# Altium footprint library WR-TBL_Pluggable PCB Header_3.81mm.PcbLib: 198 footprints (part 4 of 13)
Each footprint in its own frame and in the unit in brackets; x right, y up, seen from the top. Pads: shape width x height; smd on the part's side, far side on the other; paste and mask are expansions set on the pad; w line width, h text height; cw(c..) or ccw(c..) is an arc to the next point about the centre after c.
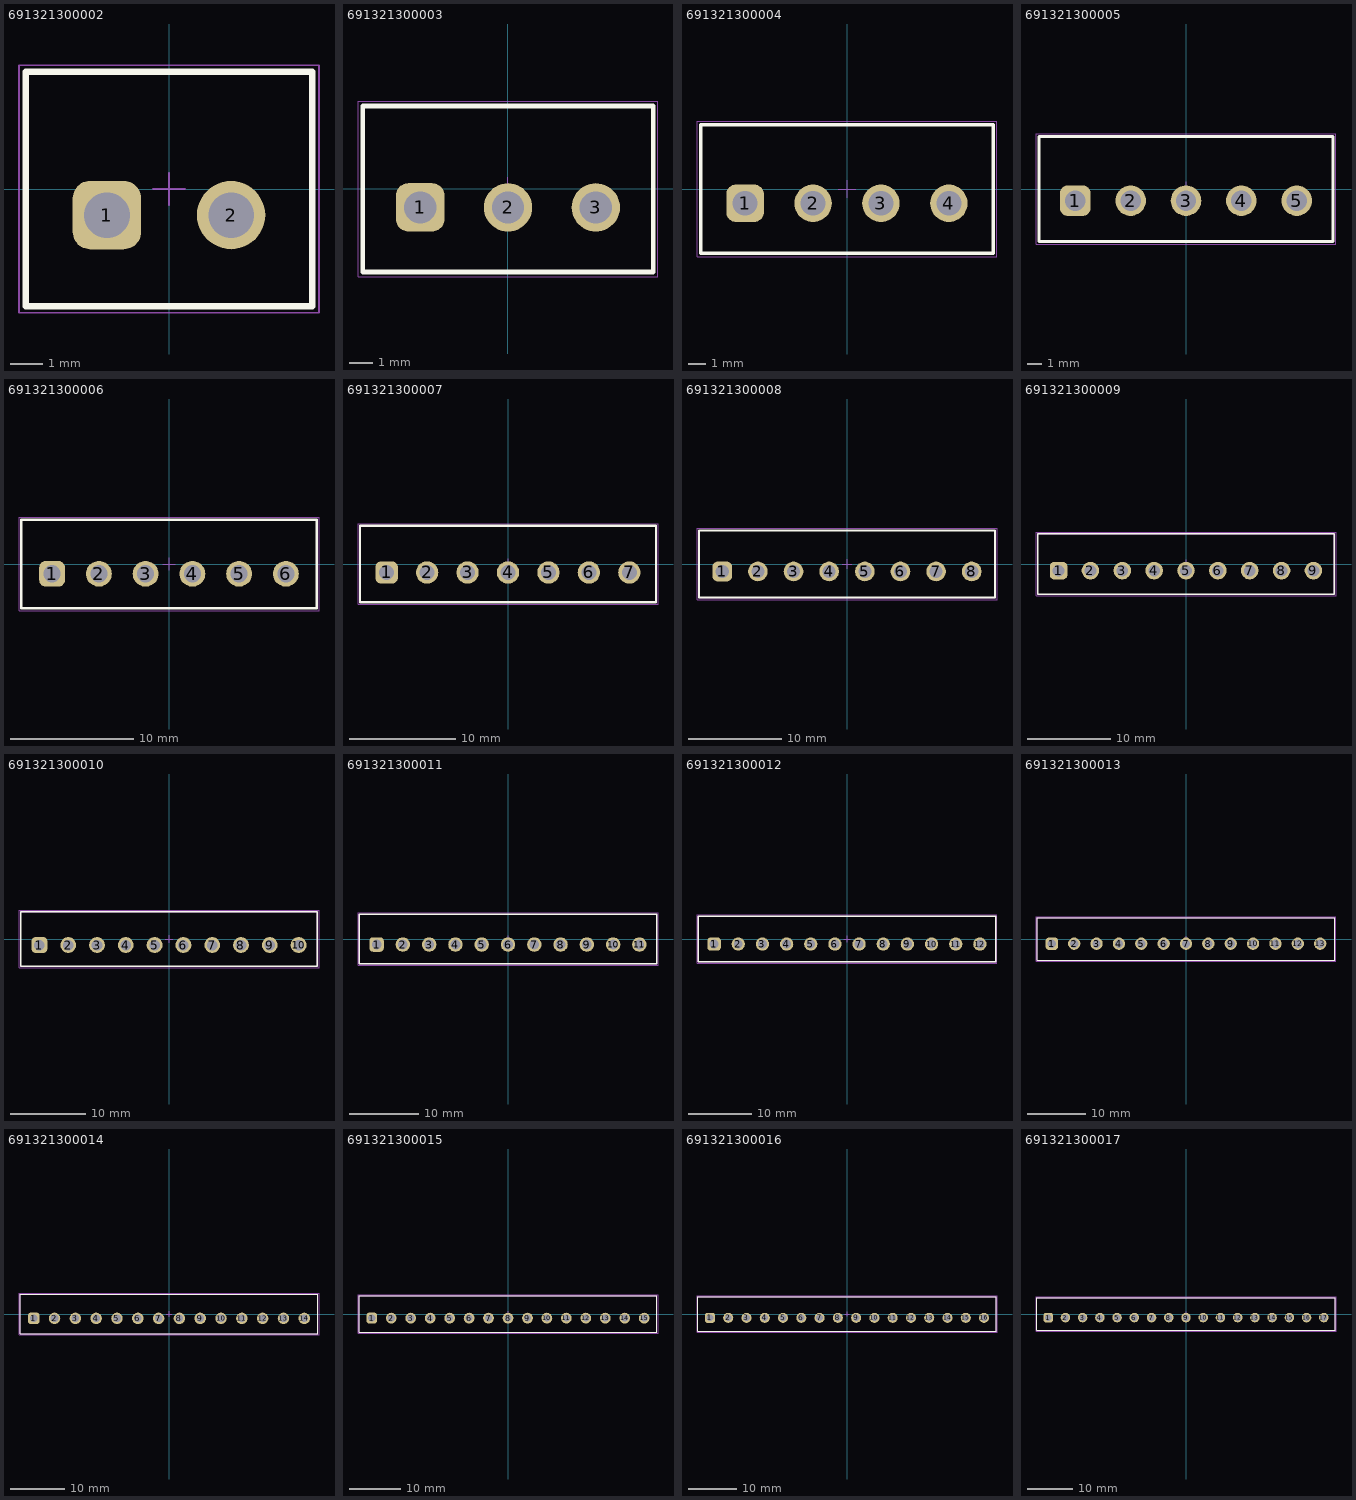
[diagram p3: the footprints below, top view; thin cyan lines are the x and y axes]

## 691321300002 [mm] "Vertical PCB Header, pitch 3.81mm, 02p"
height 9.2
pads (2):
  rrect50% 2.1x2.1 hole 1.4: 1(-1.905,-0.8)
  round 2.1 hole 1.4: 2(1.905,-0.8)
Top Overlay:
  lines w0.2: -4.405,-3.6 4.405,-3.6 4.405,3.6 -4.405,3.6 -4.405,-3.6
Top Designator:
  text ".Designator" at -7.498,-0.5 h1.5
Top Component Outline:
  lines w0.1: -4.405,-3.6 -4.405,3.6 4.405,3.6 4.405,-3.6 -4.405,-3.6
Top 3D Body:
  lines w0.1: -4.405,-3.6 4.405,-3.6 4.405,3.6 -4.405,3.6 -4.405,-3.6
Top Courtyard:
  lines w0.05: -0.5,0 0.5,0 ; 0,-0.5 0,0.5 ; -4.605,-3.8 -4.605,3.8 4.605,3.8 4.605,-3.8 -4.605,-3.8
3D body "691321300002.stp": height 9.25, standoff -3.45, extent -4.405,-3.6 4.405,3.6

## 691321300003 [mm] "Vertical PCB Header, pitch 3.81mm, 03p"
height 9.2
pads (3):
  rrect50% 2.1x2.1 hole 1.4: 1(-3.81,-0.8)
  round 2.1 hole 1.4: 2(0,-0.8) 3(3.81,-0.8)
Top Overlay:
  lines w0.2: -6.31,-3.6 -6.31,3.6 6.31,3.6 6.31,-3.6 -6.31,-3.6
Top Designator:
  text ".Designator" at -7.498,-0.5 h1.5
Top Component Outline:
  lines w0.1: -6.31,-3.6 6.31,-3.6 6.31,3.6 -6.31,3.6 -6.31,-3.6
Top 3D Body:
  lines w0.1: -6.31,-3.6 -6.31,3.6 6.31,3.6 6.31,-3.6 -6.31,-3.6
Top Courtyard:
  lines w0.05: -0.5,0 0.5,0 ; 0,-0.5 0,0.5 ; -6.51,-3.8 6.51,-3.8 6.51,3.8 -6.51,3.8 -6.51,-3.8
3D body "691321300003.stp": height 9.25, standoff -3.45, extent -6.31,-3.6 6.31,3.6

## 691321300004 [mm] "Vertical PCB Header, pitch 3.81mm, 04p"
height 9.2
pads (4):
  rrect50% 2.1x2.1 hole 1.4: 1(-5.715,-0.8)
  round 2.1 hole 1.4: 2(-1.905,-0.8) 3(1.905,-0.8) 4(5.715,-0.8)
Top Overlay:
  lines w0.2: -8.215,-3.6 -8.215,3.6 8.215,3.6 8.215,-3.6 -8.215,-3.6
Top Designator:
  text ".Designator" at -7.498,-0.5 h1.5
Top Component Outline:
  lines w0.1: -8.215,-3.6 8.215,-3.6 8.215,3.6 -8.215,3.6 -8.215,-3.6
Top 3D Body:
  lines w0.1: -8.215,-3.6 -8.215,3.6 8.215,3.6 8.215,-3.6 -8.215,-3.6
Top Courtyard:
  lines w0.05: -0.5,0 0.5,0 ; 0,-0.5 0,0.5 ; -8.415,-3.8 8.415,-3.8 8.415,3.8 -8.415,3.8 -8.415,-3.8
3D body "691321300004.stp": height 9.25, standoff -3.45, extent -8.215,-3.6 8.215,3.6

## 691321300005 [mm] "Vertical PCB Header, pitch 3.81mm, 05p"
height 9.2
pads (5):
  rrect50% 2.1x2.1 hole 1.4: 1(-7.62,-0.8)
  round 2.1 hole 1.4: 2(-3.81,-0.8) 3(0,-0.8) 4(3.81,-0.8) 5(7.62,-0.8)
Top Overlay:
  lines w0.2: -10.12,-3.6 -10.12,3.6 10.12,3.6 10.12,-3.6 -10.12,-3.6
Top Designator:
  text ".Designator" at -7.498,-0.5 h1.5
Top Component Outline:
  lines w0.1: -10.12,-3.6 10.12,-3.6 10.12,3.6 -10.12,3.6 -10.12,-3.6
Top 3D Body:
  lines w0.1: -10.12,-3.6 -10.12,3.6 10.12,3.6 10.12,-3.6 -10.12,-3.6
Top Courtyard:
  lines w0.05: -0.5,0 0.5,0 ; 0,-0.5 0,0.5 ; -10.32,-3.8 10.32,-3.8 10.32,3.8 -10.32,3.8 -10.32,-3.8
3D body "691321300005.stp": height 9.25, standoff -3.45, extent -10.12,-3.6 10.12,3.6

## 691321300006 [mm] "Vertical PCB Header, pitch 3.81mm, 06p"
height 9.2
pads (6):
  rrect50% 2.1x2.1 hole 1.4: 1(-9.525,-0.8)
  round 2.1 hole 1.4: 2(-5.715,-0.8) 3(-1.905,-0.8) 4(1.905,-0.8) 5(5.715,-0.8) 6(9.525,-0.8)
Top Overlay:
  lines w0.2: -12.025,-3.6 12.025,-3.6 12.025,3.6 -12.025,3.6 -12.025,-3.6
Top Designator:
  text ".Designator" at -7.498,-0.5 h1.5
Top Component Outline:
  lines w0.1: -12.025,-3.6 -12.025,3.6 12.025,3.6 12.025,-3.6 -12.025,-3.6
Top 3D Body:
  lines w0.1: -12.025,-3.6 12.025,-3.6 12.025,3.6 -12.025,3.6 -12.025,-3.6
Top Courtyard:
  lines w0.05: -0.5,0 0.5,0 ; 0,-0.5 0,0.5 ; -12.225,-3.8 -12.225,3.8 12.225,3.8 12.225,-3.8 -12.225,-3.8
3D body "691321300006.stp": height 9.25, standoff -3.45, extent -12.025,-3.6 12.025,3.6

## 691321300007 [mm] "Vertical PCB Header, pitch 3.81mm, 07p"
height 9.2
pads (7):
  rrect50% 2.1x2.1 hole 1.4: 1(-11.43,-0.8)
  round 2.1 hole 1.4: 2(-7.62,-0.8) 3(-3.81,-0.8) 4(0,-0.8) 5(3.81,-0.8) 6(7.62,-0.8) 7(11.43,-0.8)
Top Overlay:
  lines w0.2: -13.93,-3.6 -13.93,3.6 13.93,3.6 13.93,-3.6 -13.93,-3.6
Top Designator:
  text ".Designator" at -7.498,-0.5 h1.5
Top Component Outline:
  lines w0.1: -13.93,-3.6 13.93,-3.6 13.93,3.6 -13.93,3.6 -13.93,-3.6
Top 3D Body:
  lines w0.1: -13.93,-3.6 -13.93,3.6 13.93,3.6 13.93,-3.6 -13.93,-3.6
Top Courtyard:
  lines w0.05: -0.5,0 0.5,0 ; 0,-0.5 0,0.5 ; -14.13,-3.8 14.13,-3.8 14.13,3.8 -14.13,3.8 -14.13,-3.8
3D body "691321300007.stp": height 9.25, standoff -3.45, extent -13.93,-3.6 13.93,3.6

## 691321300008 [mm] "Vertical PCB Header, pitch 3.81mm, 08p"
height 9.2
pads (8):
  rrect50% 2.1x2.1 hole 1.4: 1(-13.335,-0.8)
  round 2.1 hole 1.4: 2(-9.525,-0.8) 3(-5.715,-0.8) 4(-1.905,-0.8) 5(1.905,-0.8) 6(5.715,-0.8) 7(9.525,-0.8) 8(13.335,-0.8)
Top Overlay:
  lines w0.2: -15.835,-3.6 -15.835,3.6 15.835,3.6 15.835,-3.6 -15.835,-3.6
Top Designator:
  text ".Designator" at -7.498,-0.5 h1.5
Top Component Outline:
  lines w0.1: -15.835,-3.6 15.835,-3.6 15.835,3.6 -15.835,3.6 -15.835,-3.6
Top 3D Body:
  lines w0.1: -15.835,-3.6 -15.835,3.6 15.835,3.6 15.835,-3.6 -15.835,-3.6
Top Courtyard:
  lines w0.05: -0.5,0 0.5,0 ; 0,-0.5 0,0.5 ; -16.035,-3.8 16.035,-3.8 16.035,3.8 -16.035,3.8 -16.035,-3.8
3D body "691321300008.stp": height 9.25, standoff -3.45, extent -15.835,-3.6 15.835,3.6

## 691321300009 [mm] "Vertical PCB Header, pitch 3.81mm, 09p"
height 9.2
pads (9):
  rrect50% 2.1x2.1 hole 1.4: 1(-15.24,-0.8)
  round 2.1 hole 1.4: 2(-11.43,-0.8) 3(-7.62,-0.8) 4(-3.81,-0.8) 5(0,-0.8) 6(3.81,-0.8) 7(7.62,-0.8) 8(11.43,-0.8) 9(15.24,-0.8)
Top Overlay:
  lines w0.2: -17.74,-3.6 17.74,-3.6 17.74,3.6 -17.74,3.6 -17.74,-3.6
Top Designator:
  text ".Designator" at -7.498,-0.5 h1.5
Top Component Outline:
  lines w0.1: -17.74,-3.6 -17.74,3.6 17.74,3.6 17.74,-3.6 -17.74,-3.6
Top 3D Body:
  lines w0.1: -17.74,-3.6 17.74,-3.6 17.74,3.6 -17.74,3.6 -17.74,-3.6
Top Courtyard:
  lines w0.05: -0.5,0 0.5,0 ; 0,-0.5 0,0.5 ; -17.94,-3.8 -17.94,3.8 17.94,3.8 17.94,-3.8 -17.94,-3.8
3D body "691321300009.stp": height 9.25, standoff -3.45, extent -17.74,-3.6 17.74,3.6

## 691321300010 [mm] "Vertical PCB Header, pitch 3.81mm, 10p"
height 9.2
pads (10):
  rrect50% 2.1x2.1 hole 1.4: 1(-17.145,-0.8)
  round 2.1 hole 1.4: 2(-13.335,-0.8) 3(-9.525,-0.8) 4(-5.715,-0.8) 5(-1.905,-0.8) 6(1.905,-0.8) 7(5.715,-0.8) 8(9.525,-0.8) 9(13.335,-0.8) 10(17.145,-0.8)
Top Overlay:
  lines w0.2: -19.645,-3.6 -19.645,3.6 19.645,3.6 19.645,-3.6 -19.645,-3.6
Top Designator:
  text ".Designator" at -7.498,-0.5 h1.5
Top Component Outline:
  lines w0.1: -19.645,-3.6 19.645,-3.6 19.645,3.6 -19.645,3.6 -19.645,-3.6
Top 3D Body:
  lines w0.1: -19.645,-3.6 -19.645,3.6 19.645,3.6 19.645,-3.6 -19.645,-3.6
Top Courtyard:
  lines w0.05: -0.5,0 0.5,0 ; 0,-0.5 0,0.5 ; -19.845,-3.8 19.845,-3.8 19.845,3.8 -19.845,3.8 -19.845,-3.8
3D body "691321300010.stp": height 9.25, standoff -3.45, extent -19.645,-3.6 19.645,3.6

## 691321300011 [mm] "Vertical PCB Header, pitch 3.81mm, 11p"
height 9.2
pads (11):
  rrect50% 2.1x2.1 hole 1.4: 1(-19.05,-0.8)
  round 2.1 hole 1.4: 2(-15.24,-0.8) 3(-11.43,-0.8) 4(-7.62,-0.8) 5(-3.81,-0.8) 6(0,-0.8) 7(3.81,-0.8) 8(7.62,-0.8) 9(11.43,-0.8) 10(15.24,-0.8) 11(19.05,-0.8)
Top Overlay:
  lines w0.2: -21.55,-3.6 -21.55,3.6 21.55,3.6 21.55,-3.6 -21.55,-3.6
Top Designator:
  text ".Designator" at -7.498,-0.5 h1.5
Top Component Outline:
  lines w0.1: -21.55,-3.6 21.55,-3.6 21.55,3.6 -21.55,3.6 -21.55,-3.6
Top 3D Body:
  lines w0.1: -21.55,-3.6 -21.55,3.6 21.55,3.6 21.55,-3.6 -21.55,-3.6
Top Courtyard:
  lines w0.05: -0.5,0 0.5,0 ; 0,-0.5 0,0.5 ; -21.75,-3.8 21.75,-3.8 21.75,3.8 -21.75,3.8 -21.75,-3.8
3D body "691321300011.stp": height 9.25, standoff -3.45, extent -21.55,-3.6 21.55,3.6

## 691321300012 [mm] "Vertical PCB Header, pitch 3.81mm, 12p"
height 9.2
pads (12):
  rrect50% 2.1x2.1 hole 1.4: 1(-20.955,-0.8)
  round 2.1 hole 1.4: 2(-17.145,-0.8) 3(-13.335,-0.8) 4(-9.525,-0.8) 5(-5.715,-0.8) 6(-1.905,-0.8) 7(1.905,-0.8) 8(5.715,-0.8) 9(9.525,-0.8) 10(13.335,-0.8) 11(17.145,-0.8) 12(20.955,-0.8)
Top Overlay:
  lines w0.2: -23.455,-3.6 23.455,-3.6 23.455,3.6 -23.455,3.6 -23.455,-3.6
Top Designator:
  text ".Designator" at -7.498,-0.5 h1.5
Top Component Outline:
  lines w0.1: -23.455,-3.6 -23.455,3.6 23.455,3.6 23.455,-3.6 -23.455,-3.6
Top 3D Body:
  lines w0.1: -23.455,-3.6 23.455,-3.6 23.455,3.6 -23.455,3.6 -23.455,-3.6
Top Courtyard:
  lines w0.05: -0.5,0 0.5,0 ; 0,-0.5 0,0.5 ; -23.655,-3.8 -23.655,3.8 23.655,3.8 23.655,-3.8 -23.655,-3.8
3D body "691321300012.stp": height 9.25, standoff -3.45, extent -23.455,-3.6 23.455,3.6

## 691321300013 [mm] "Vertical PCB Header, pitch 3.81mm, 13p"
height 9.2
pads (13):
  rrect50% 2.1x2.1 hole 1.4: 1(-22.86,-0.8)
  round 2.1 hole 1.4: 2(-19.05,-0.8) 3(-15.24,-0.8) 4(-11.43,-0.8) 5(-7.62,-0.8) 6(-3.81,-0.8) 7(0,-0.8) 8(3.81,-0.8) 9(7.62,-0.8) 10(11.43,-0.8) 11(15.24,-0.8) 12(19.05,-0.8) 13(22.86,-0.8)
Top Overlay:
  lines w0.2: -25.36,-3.6 25.36,-3.6 25.36,3.6 -25.36,3.6 -25.36,-3.6
Top Designator:
  text ".Designator" at -7.498,-0.5 h1.5
Top Component Outline:
  lines w0.1: -25.36,-3.6 -25.36,3.6 25.36,3.6 25.36,-3.6 -25.36,-3.6
Top 3D Body:
  lines w0.1: -25.36,-3.6 25.36,-3.6 25.36,3.6 -25.36,3.6 -25.36,-3.6
Top Courtyard:
  lines w0.05: -0.5,0 0.5,0 ; 0,-0.5 0,0.5 ; -25.56,-3.8 -25.56,3.8 25.56,3.8 25.56,-3.8 -25.56,-3.8
3D body "691321300013.stp": height 9.25, standoff -3.45, extent -25.36,-3.6 25.36,3.6

## 691321300014 [mm] "Vertical PCB Header, pitch 3.81mm, 14p"
height 9.2
pads (14):
  rrect50% 2.1x2.1 hole 1.4: 1(-24.765,-0.8)
  round 2.1 hole 1.4: 2(-20.955,-0.8) 3(-17.145,-0.8) 4(-13.335,-0.8) 5(-9.525,-0.8) 6(-5.715,-0.8) 7(-1.905,-0.8) 8(1.905,-0.8) 9(5.715,-0.8) 10(9.525,-0.8) 11(13.335,-0.8) 12(17.145,-0.8) 13(20.955,-0.8) 14(24.765,-0.8)
Top Overlay:
  lines w0.2: -27.265,-3.6 27.265,-3.6 27.265,3.6 -27.265,3.6 -27.265,-3.6
Top Designator:
  text ".Designator" at -7.498,-0.5 h1.5
Top Component Outline:
  lines w0.1: -27.265,-3.6 -27.265,3.6 27.265,3.6 27.265,-3.6 -27.265,-3.6
Top 3D Body:
  lines w0.1: -27.265,-3.6 27.265,-3.6 27.265,3.6 -27.265,3.6 -27.265,-3.6
Top Courtyard:
  lines w0.05: -0.5,0 0.5,0 ; 0,-0.5 0,0.5 ; -27.465,-3.8 -27.465,3.8 27.465,3.8 27.465,-3.8 -27.465,-3.8
3D body "691321300014.stp": height 9.25, standoff -3.45, extent -27.265,-3.6 27.265,3.6

## 691321300015 [mm] "Vertical PCB Header, pitch 3.81mm, 15p"
height 9.2
pads (15):
  rrect50% 2.1x2.1 hole 1.4: 1(-26.67,-0.8)
  round 2.1 hole 1.4: 2(-22.86,-0.8) 3(-19.05,-0.8) 4(-15.24,-0.8) 5(-11.43,-0.8) 6(-7.62,-0.8) 7(-3.81,-0.8) 8(0,-0.8) 9(3.81,-0.8) 10(7.62,-0.8) 11(11.43,-0.8) 12(15.24,-0.8) 13(19.05,-0.8) 14(22.86,-0.8) 15(26.67,-0.8)
Top Overlay:
  lines w0.2: -29.17,-3.6 29.17,-3.6 29.17,3.6 -29.17,3.6 -29.17,-3.6
Top Designator:
  text ".Designator" at -7.498,-0.5 h1.5
Top Component Outline:
  lines w0.1: -29.17,-3.6 -29.17,3.6 29.17,3.6 29.17,-3.6 -29.17,-3.6
Top 3D Body:
  lines w0.1: -29.17,-3.6 29.17,-3.6 29.17,3.6 -29.17,3.6 -29.17,-3.6
Top Courtyard:
  lines w0.05: -0.5,0 0.5,0 ; 0,-0.5 0,0.5 ; -29.37,-3.8 -29.37,3.8 29.37,3.8 29.37,-3.8 -29.37,-3.8
3D body "691321300015.stp": height 9.25, standoff -3.45, extent -29.17,-3.6 29.17,3.6

## 691321300016 [mm] "Vertical PCB Header, pitch 3.81mm, 16p"
height 9.2
pads (16):
  rrect50% 2.1x2.1 hole 1.4: 1(-28.575,-0.8)
  round 2.1 hole 1.4: 2(-24.765,-0.8) 3(-20.955,-0.8) 4(-17.145,-0.8) 5(-13.335,-0.8) 6(-9.525,-0.8) 7(-5.715,-0.8) 8(-1.905,-0.8) 9(1.905,-0.8) 10(5.715,-0.8) 11(9.525,-0.8) 12(13.335,-0.8) 13(17.145,-0.8) 14(20.955,-0.8) 15(24.765,-0.8) 16(28.575,-0.8)
Top Overlay:
  lines w0.2: -31.075,-3.6 31.075,-3.6 31.075,3.6 -31.075,3.6 -31.075,-3.6
Top Designator:
  text ".Designator" at -7.498,-0.5 h1.5
Top Component Outline:
  lines w0.1: -31.075,-3.6 -31.075,3.6 31.075,3.6 31.075,-3.6 -31.075,-3.6
Top 3D Body:
  lines w0.1: -31.075,-3.6 31.075,-3.6 31.075,3.6 -31.075,3.6 -31.075,-3.6
Top Courtyard:
  lines w0.05: -0.5,0 0.5,0 ; 0,-0.5 0,0.5 ; -31.275,-3.8 -31.275,3.8 31.275,3.8 31.275,-3.8 -31.275,-3.8
3D body "691321300016.stp": height 9.25, standoff -3.45, extent -31.075,-3.6 31.075,3.6

## 691321300017 [mm] "Vertical PCB Header, pitch 3.81mm, 17p"
height 9.2
pads (17):
  rrect50% 2.1x2.1 hole 1.4: 1(-30.48,-0.8)
  round 2.1 hole 1.4: 2(-26.67,-0.8) 3(-22.86,-0.8) 4(-19.05,-0.8) 5(-15.24,-0.8) 6(-11.43,-0.8) 7(-7.62,-0.8) 8(-3.81,-0.8) 9(0,-0.8) 10(3.81,-0.8) 11(7.62,-0.8) 12(11.43,-0.8) 13(15.24,-0.8) 14(19.05,-0.8) 15(22.86,-0.8) 16(26.67,-0.8) 17(30.48,-0.8)
Top Overlay:
  lines w0.2: -32.98,-3.6 -32.98,3.6 32.98,3.6 32.98,-3.6 -32.98,-3.6
Top Designator:
  text ".Designator" at -7.498,-0.5 h1.5
Top Component Outline:
  lines w0.1: -32.98,-3.6 32.98,-3.6 32.98,3.6 -32.98,3.6 -32.98,-3.6
Top 3D Body:
  lines w0.1: -32.98,-3.6 -32.98,3.6 32.98,3.6 32.98,-3.6 -32.98,-3.6
Top Courtyard:
  lines w0.05: -0.5,0 0.5,0 ; 0,-0.5 0,0.5 ; -33.18,-3.8 33.18,-3.8 33.18,3.8 -33.18,3.8 -33.18,-3.8
3D body "691321300017.stp": height 9.25, standoff -3.45, extent -32.98,-3.6 32.98,3.6